# Altium integrated library Integrated Chips.IntLib: 79 symbols
Pins are listed as number, name and electrical type; pins without a type are passive.

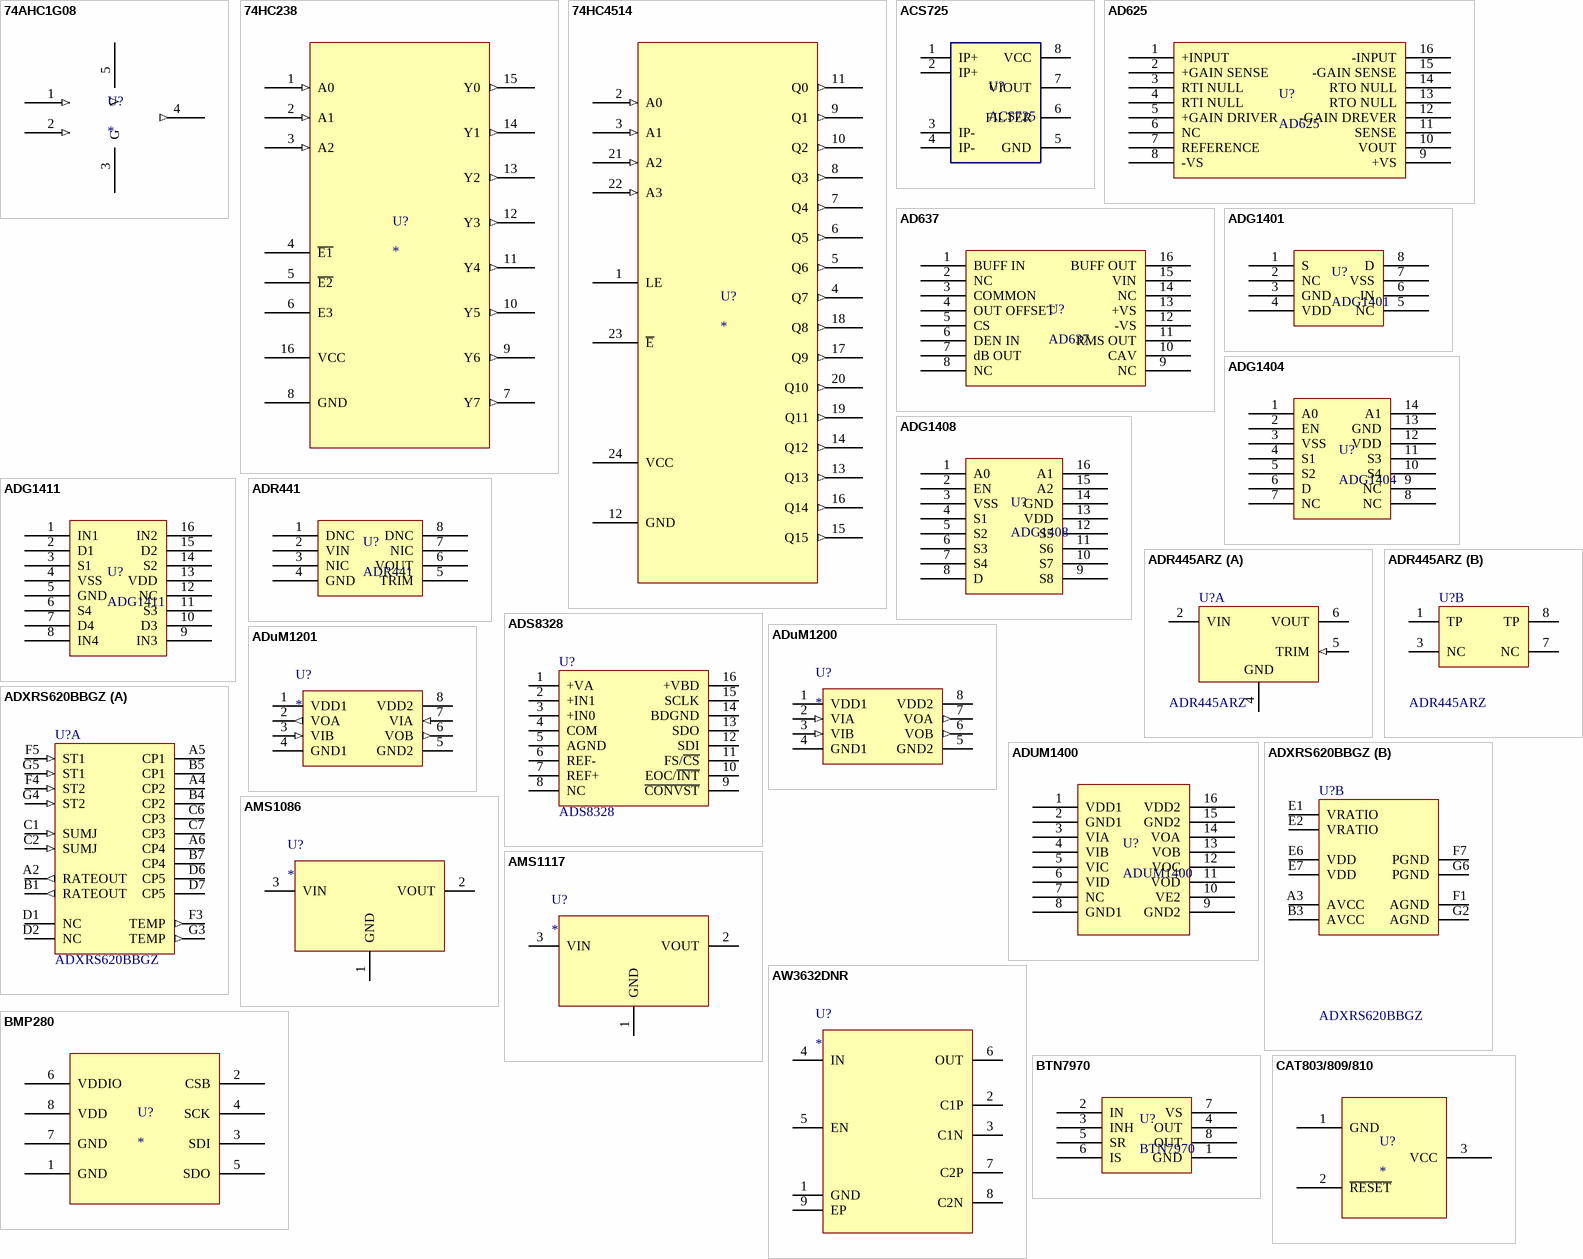
[diagram p0: symbols 74AHC1G08 to CAT803/809/810]

## 74AHC1G08
designator U?
2-input AND gate
footprint SC70_5(SOT353) (SOT353, 5-Leads, Body 2.00x2.10mm, Pitch 0.65mm, IPC Medium Density)
pins: 1 (in), 2 (in), 3 G (power), 4 (out), 5 V (power)

## 74HC238
designator U?
3-to-8 line decoder/demultiplexer
footprint SOIC16_150 (SOP, 16-Leads, Body 9.90x3.90mm, Pitch 1.27mm, IPC Medium Density)
pins: 1 A0 (in), 2 A1 (in), 3 A2 (in), 4 ~{E1}, 5 ~{E2}, 6 E3, 7 Y7 (out), 8 GND (power), 9 Y6 (out), 10 Y5 (out), 11 Y4 (out), 12 Y3 (out), 13 Y2 (out), 14 Y1 (out), 15 Y0 (out), 16 VCC (power)

## 74HC4514
designator U?
4-to-16 line decoder/demultiplexer with input latches
footprint SOIC24_300 (SOIC, 24-Leads, Body 15.40x7.50mm, Pitch 1.27mm, IPC Medium Density)
pins: 1 LE, 2 A0 (in), 3 A1 (in), 4 Q7 (out), 5 Q6 (out), 6 Q5 (out), 7 Q4 (out), 8 Q3 (out), 9 Q1 (out), 10 Q2 (out), 11 Q0 (out), 12 GND (power), 13 Q13 (out), 14 Q12 (out), 15 Q15 (out), 16 Q14 (out), 17 Q9 (out), 18 Q8 (out), 19 Q11 (out), 20 Q10 (out), 21 A2 (in), 22 A3 (in), 23 ~{E}, 24 VCC (power)

## ACS725
designator U?
Automotive-Grade, Galvanically Isolated Current Sensor IC  ACS725 With Common-Mode Field Rejection in a Small Footprint SOIC8 Package
footprint SOIC8_150
pins: 1 IP+, 2 IP+, 3 IP-, 4 IP-, 5 GND, 6 FILTER, 7 VIOUT, 8 VCC

## AD625
designator U?
Programmable Gain Instrumentation Amplifier
footprint DIP16
pins: 1 +INPUT, 2 +GAIN SENSE, 3 RTI NULL, 4 RTI NULL, 5 +GAIN DRIVER, 6 NC, 7 REFERENCE, 8 -VS, 9 +VS, 10 VOUT, 11 SENSE, 12 -GAIN DREVER, 13 RTO NULL, 14 RTO NULL, 15 -GAIN SENSE, 16 -INPUT

## AD637
designator U?
High Precision, Wideband RMS-to-DC Converter
footprint SOIC16_300
pins: 1 BUFF IN, 2 NC, 3 COMMON, 4 OUT OFFSET, 5 CS, 6 DEN IN, 7 dB OUT, 8 NC, 9 NC, 10 CAV, 11 RMS OUT, 12 -VS, 13 +VS, 14 NC, 15 VIN, 16 BUFF OUT

## ADG1401
designator U?
1 Ω On Resistance, ±15 V/+12 V/±5 V iCMOS SPST Switches
footprint MSOP8 (TSOP, 8-Leads, Body 3.00x3.00mm, Pitch 0.65mm, IPC Medium Density)
pins: 1 S, 2 NC, 3 GND, 4 VDD, 5 NC, 6 IN, 7 VSS, 8 D

## ADG1404
designator U?
1.5 Ω On Resistance, ±15 V/12 V/±5 V, 4:1, i CMOS Mulitiplexers
footprint TSSOP14
pins: 1 A0, 2 EN, 3 VSS, 4 S1, 5 S2, 6 D, 7 NC, 8 NC, 9 NC, 10 S4, 11 S3, 12 VDD, 13 GND, 14 A1

## ADG1408
designator U?
4Ω R on , 4-/8-Channel ±15 V/+12 V/±5 V i CMOS Mulitiplexers
footprint TSSOP16 (TSOP, 16-Leads, Body 5.00x4.40mm, Pitch 0.65mm, IPC Medium Density)
pins: 1 A0, 2 EN, 3 VSS, 4 S1, 5 S2, 6 S3, 7 S4, 8 D, 9 S8, 10 S7, 11 S6, 12 S5, 13 VDD, 14 GND, 15 A2, 16 A1

## ADG1411
designator U?
1.5_Ω_On_Resistance,_±15_V/+12_V/±5_V,_iCMOS,_Quad_SPST_Switches
footprint TSSOP16 (TSOP, 16-Leads, Body 5.00x4.40mm, Pitch 0.65mm, IPC Medium Density)
pins: 1 IN1, 2 D1, 3 S1, 4 VSS, 5 GND, 6 S4, 7 D4, 8 IN4, 9 IN3, 10 D3, 11 S3, 12 NC, 13 VDD, 14 S2, 15 D2, 16 IN2

## ADR441
designator U?
Ultralow_Noise,_LDO_XFET_Voltage_References_with_Current_Sink_and_Source
footprint SOIC8_150
pins: 1 DNC, 2 VIN, 3 NIC, 4 GND, 5 TRIM, 6 VOUT, 7 NIC, 8 DNC

## ADR445ARZ
designator U?
Ultralow Noise, LDO XFET Voltage Reference with Current Sink and Source, 5 V Output, 5.5 to 18 V Supply, Industrial, 8-pin SOIC (R-8), Tube; Manufacturer: Analog Devices; Max V Supply (V): 18; Min V Supply (V): 5.5; Ref Out TC (ppm/C): 2; Vout: 5V; DatasheetVersion: Rev. E; PackageVersion: 060506-A, 06/2006; PackageReference: R-8; PackageDescription: 8-Pin Standard Small Outline Package, Body 4.9 x 3.9 mm, Pitch 1.27 mm; Supplier 1: Digi-Key; Supplier Part Number 1: ADR445ARZ-ND; Supplier 2: Farnell; Supplier Part Number 2: 1274149; Supplier 3: Mouser; Supplier Part Number 3: 584-ADR445ARZ; Packing: Tube; Operating Temp Range: -40 to 125 degC; Mounting Technology: Surface Mount; Code_JEDEC: MS-012-AA; PartNumber: ADR445ARZ; ComponentLink1Description: Manufacturer URL; ComponentLink1URL: http://www.analog.com/en/index.html; ComponentLink2Description: Datasheet; ComponentLink2URL: http://www.analog.com/static/imported-files/data_sheets/ADR440_441_443_444_445.pdf; ComponentLink3Description: Package Specification; ComponentLink3URL: http://www.analog.com/static/imported-files/packages/PKG_PDF/SOIC_Narrow%20(R)/R_8.pdf; ComponentLink4Description: URL Link1; ComponentLink4URL: Product URL:http://www.analog.com/en/special-linear-functions/voltage-references/adr445/products/product.html
footprint SOIC8_150
part A pins: 2 VIN (power), 4 GND (power), 5 TRIM (in), 6 VOUT (power)
part B pins: 1 TP, 3 NC, 7 NC, 8 TP

## ADS8328
designator U?
16 Bit AD Converter, dual unipolar input
footprint TSSOP16 (TSOP, 16-Leads, Body 5.00x4.40mm, Pitch 0.65mm, IPC Medium Density)
pins: 1 +VA (power), 2 +IN1 (power), 3 +IN0 (power), 4 COM (power), 5 AGND (power), 6 REF- (power), 7 REF+ (power), 8 NC (power), 9 ~{CONVST} (power), 10 EOC/~{INT} (power), 11 FS/~{CS} (power), 12 SDI (power), 13 SDO (power), 14 BDGND (power), 15 SCLK (power), 16 +VBD (power)

## ADuM1200
designator U?
footprint SOIC8_150
pins: 1 VDD1 (power), 2 VIA (in), 3 VIB (in), 4 GND1 (power), 5 GND2 (power), 6 VOB (out), 7 VOA (out), 8 VDD2 (power)

## ADuM1201
designator U?
footprint SOIC8_150
pins: 1 VDD1 (power), 2 VOA (out), 3 VIB (in), 4 GND1 (power), 5 GND2 (power), 6 VOB (out), 7 VIA (in), 8 VDD2 (power)

## ADUM1400
designator U?
Quad-Channel Digital Isolators
footprint SOIC16_300
pins: 1 VDD1, 2 GND1, 3 VIA, 4 VIB, 5 VIC, 6 VID, 7 NC, 8 GND1, 9 GND2, 10 VE2, 11 VOD, 12 VOC, 13 VOB, 14 VOA, 15 GND2, 16 VDD2

## ADXRS620BBGZ
designator U?
Yaw Rate Gyroscope; Manufacturer: Analog Devices; -3dB Bandwidth: 2.5 KHz; Nonliniarity: 0.1% of FS; Output Type: Analog; Packing: Tray; Sensitivity: 6 mv/degrees/s; Supply Current: 3.5 mA; Temp Sensor: Yes; Voltage Reference: No; Voltage Supply (V): 4.75 to 5.25; DatasheetVersion: Rev. B; PackageVersion: 042307-A, 04/2007; PackageReference: BG-32-3; PackageDescription: 32-Ball Ceramic Ball Grid Array, 6.85 x 6.85 mm Body, 0.8 mm Pitch; Supplier 1: Digi-Key; Supplier Part Number 1: ADXRS620BBGZ-ND; Supplier 2: Farnell; Supplier Part Number 2: 2305763; Supplier 3: Newark; Supplier Part Number 3: 91R2569; Supplier 4: Mouser; Supplier Part Number 4: 584-ADXRS620BBGZ; Mounting Technology: Surface Mount; PartNumber: ADXRS620BBGZ; ComponentLink1Description: Manufacturer URL; ComponentLink1URL: http://www.analog.com/en/index.html; ComponentLink2Description: Datasheet; ComponentLink2URL: http://www.analog.com/static/imported-files/data_sheets/ADXRS620.pdf; ComponentLink3Description: Package Specification; ComponentLink3URL: http:/www.analog.com/static/imported-files/packages/6438543BG_32_3.pdf; ComponentLink4Description: Product URL; ComponentLink4URL: http://www.analog.com/en/mems-sensors/mems-inertial-sensors/adxrs620/products/product.html
footprint BGA32_80P_0707
part A pins: A2 RATEOUT (out) "Rate Signal Output.", A4 CP2 "Charge Pump Capacitor (22 nF).", A5 CP1 "Charge Pump Capacitor (22 nF).", A6 CP4 "Charge Pump Capacitor (22 nF).", B1 RATEOUT (out) "Rate Signal Output.", B4 CP2 "Charge Pump Capacitor (22 nF).", B5 CP1 "Charge Pump Capacitor (22 nF).", B7 CP4 "Charge Pump Capacitor (22 nF).", C1 SUMJ (in) "Output Amp Summing Junction.", C2 SUMJ (in) "Output Amp Summing Junction.", C6 CP3 "Charge Pump Capacitor (22 nF).", C7 CP3 "Charge Pump Capacitor (22 nF).", D1 NC "No Connect.", D2 NC "No Connect.", D6 CP5 (power) "HV Filter Capacitor (0.1 uF).", D7 CP5 (power) "HV Filter Capacitor (0.1 uF).", F3 TEMP (out) "Temperature Voltage Output.", F4 ST2 (in) "Self-Test for Sensor 2.", F5 ST1 (in) "Self-Test for Sensor 1.", G3 TEMP (out) "Temperature Voltage Output.", G4 ST2 (in) "Self-Test for Sensor 2.", G5 ST1 (in) "Self-Test for Sensor 1."
part B pins: A3 AVCC (power) "Positive Analog Supply.", B3 AVCC (power) "Positive Analog Supply.", E1 VRATIO (power) "Reference Supply for Ratiometric Output.", E2 VRATIO (power) "Reference Supply for Ratiometric Output.", E6 VDD (power) "Positive Charge Pump Supply.", E7 VDD (power) "Positive Charge Pump Supply.", F1 AGND (power) "Analog Supply Return.", F7 PGND (power) "Charge Pump Supply Return.", G2 AGND (power) "Analog Supply Return.", G6 PGND (power) "Charge Pump Supply Return."

## AMS1086
designator U?
footprint TO-263AA(D2PAK)
pins: 1 GND (power), 2 VOUT (power), 3 VIN (power)

## AMS1117
designator U?
footprint SOT223 (SOT223, 4-Leads, Body 6.50x7.00mm (avg), Pitch 2.30mm, IPC Medium Density)
pins: 1 GND (power), 2 VOUT (power), 3 VIN (power)

## AW3632DNR
designator U?
footprint DFN8_2X2 (QFN, 8-Leads, Body 2.00x2.00mm, Pitch 0.50mm, Thermal Pad 0.60x1.20mm, IPC Medium Density)
pins: 1 GND, 2 C1P, 3 C1N, 4 IN, 5 EN, 6 OUT, 7 C2P, 8 C2N, 9 EP

## BMP280
designator U?
Digital pressure sensor
footprint BMP280
pins: 1 GND, 2 CSB, 3 SDI, 4 SCK, 5 SDO, 6 VDDIO, 7 GND, 8 VDD

## BTN7970
designator U?
High Current PN Half Bridge / NovalithIC™
footprint TO-263-7
pins: 1 GND (power), 2 IN (power), 3 INH (power), 4 OUT (power), 5 SR (power), 6 IS (power), 7 VS (power), 8 OUT (power)

## CAT803/809/810
designator U?
3-Pin Microprocessor power supply supervisors
footprint SOT23_3_1 (SOT23, 3-Leads, Body 2.92x2.37mm, Pitch 0.95mm, IPC Medium Density)
pins: 1 GND (power), 2 ~{RESET}, 3 VCC (power)

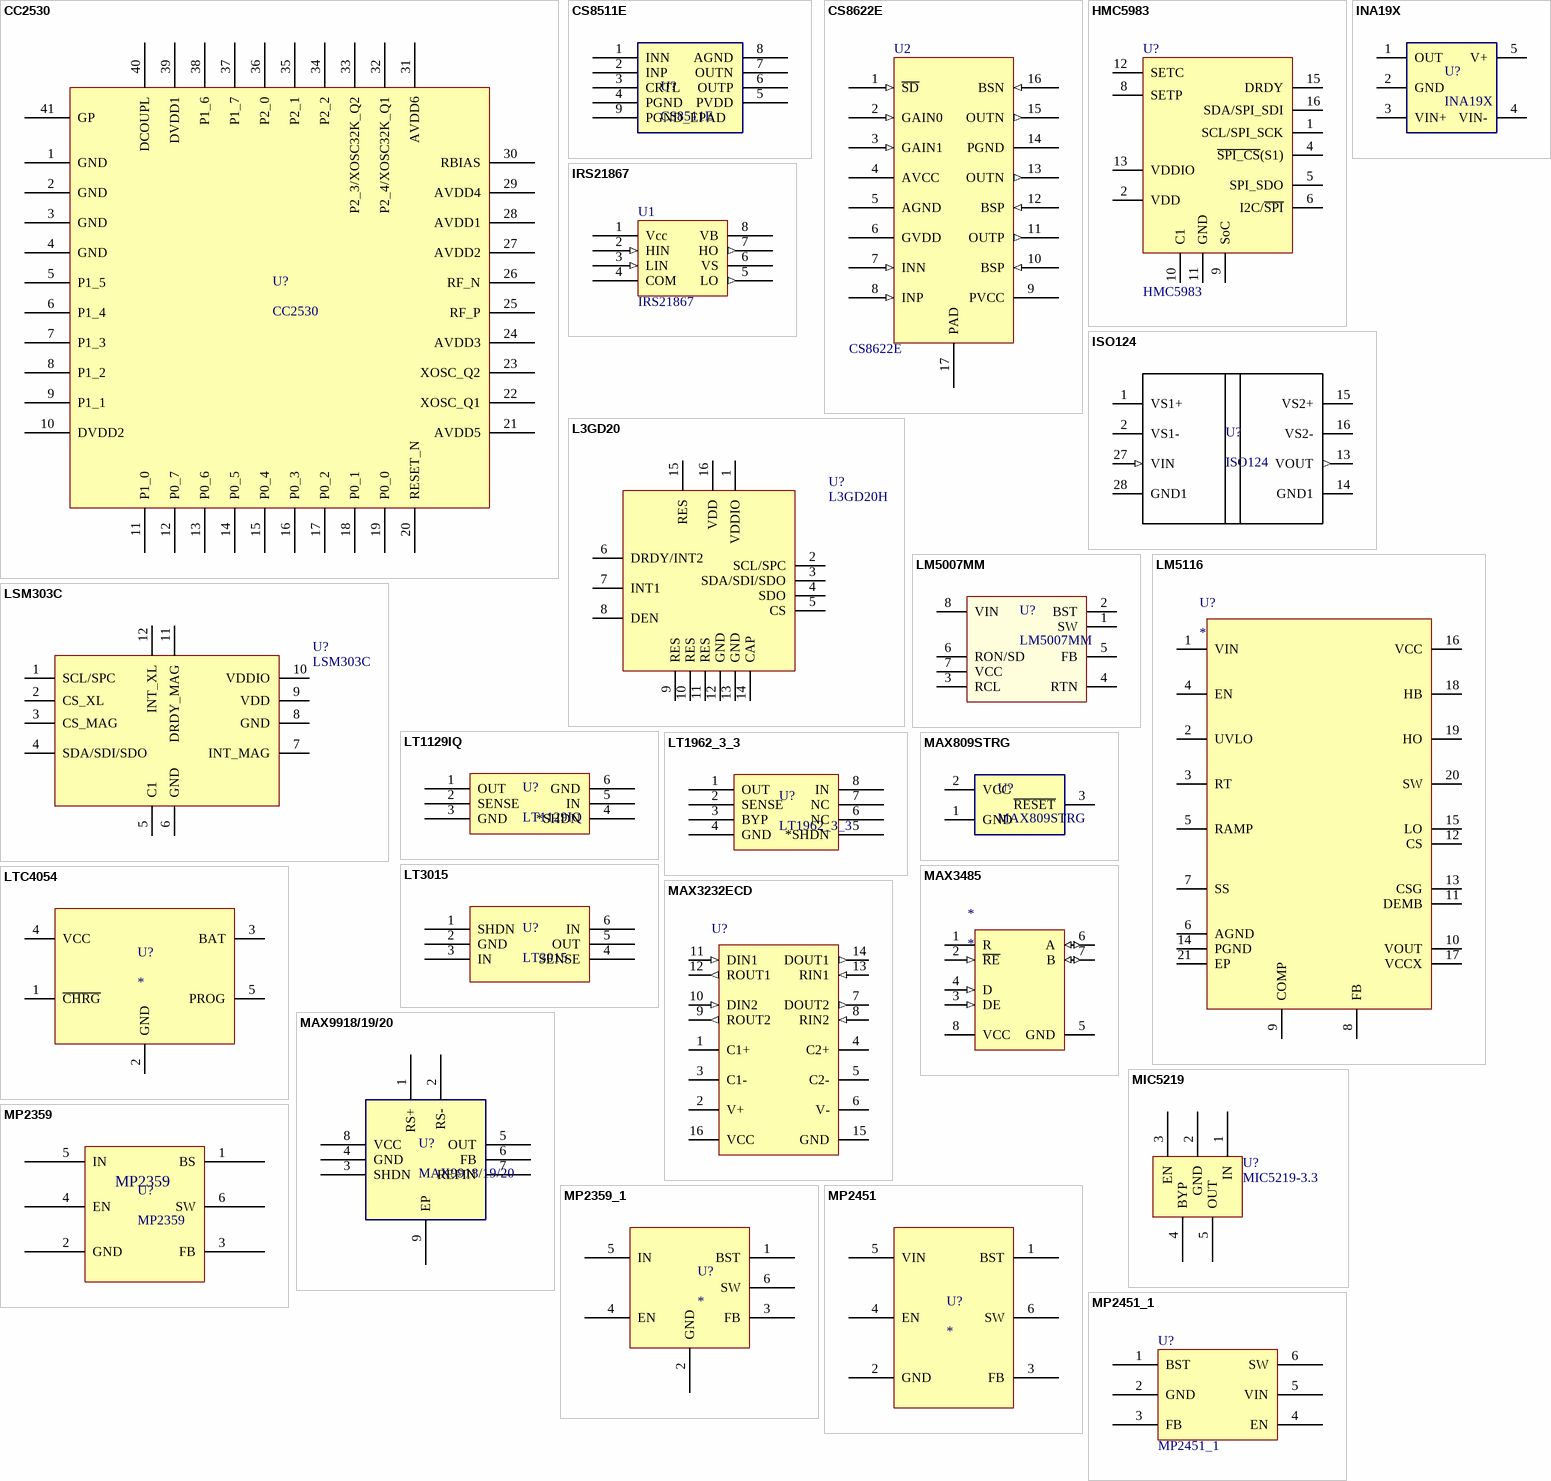
[diagram p1: symbols CC2530 to MP2451_1]

## CC2530
designator U?
2.4G Zigbee application Soc
footprint QFN40_50P_EP (PQFN, 40-Leads, Body 6.00x6.00mm, Pitch 0.50mm, Thermal Pad 4.50x4.50mm, IPC Medium Density)
pins: 1 GND, 2 GND, 3 GND, 4 GND, 5 P1_5, 6 P1_4, 7 P1_3, 8 P1_2, 9 P1_1, 10 DVDD2, 11 P1_0, 12 P0_7, 13 P0_6, 14 P0_5, 15 P0_4, 16 P0_3, 17 P0_2, 18 P0_1, 19 P0_0, 20 RESET_N, 21 AVDD5, 22 XOSC_Q1, 23 XOSC_Q2, 24 AVDD3, 25 RF_P, 26 RF_N, 27 AVDD2, 28 AVDD1, 29 AVDD4, 30 RBIAS, 31 AVDD6, 32 P2_4/XOSC32K_Q1, 33 P2_3/XOSC32K_Q2, 34 P2_2, 35 P2_1, 36 P2_0, 37 P1_7, 38 P1_6, 39 DVDD1, 40 DCOUPL, 41 GP

## CS8511E
designator U?
footprint SOIC8_150_EP (SOIC, 8-Leads, Body 4.90x3.90mm, Pitch 1.27mm, Thermal Pad 3.17x2.43mm, IPC Medium Density)
pins: 1 INN, 2 INP, 3 CRTL, 4 PGND, 5 PVDD, 6 OUTP, 7 OUTN, 8 AGND, 9 PGND_EPAD

## CS8622E
designator U2
footprint SOIC16_150_EP (SOP, 16-Leads, Body 9.90x3.90mm, Pitch 1.27mm, Thermal Pad 4.50x3.00mm, IPC Medium Density)
pins: 1 ~{SD} (in), 2 GAIN0 (in), 3 GAIN1 (in), 4 AVCC (power), 5 AGND (power), 6 GVDD (power), 7 INN (in), 8 INP (in), 9 PVCC (power), 10 BSP (in), 11 OUTP (out), 12 BSP (in), 13 OUTN (out), 14 PGND (power), 15 OUTN (out), 16 BSN (in), 17 PAD (power)

## HMC5983
designator U?
3-Axis digital compass IC
footprint QFN16_50P
pins: 1 SCL/SPI_SCK, 2 VDD, 4 ~{SPI_CS}(S1), 5 SPI_SDO, 6 I2C/~{SPI}, 8 SETP, 9 SoC, 10 C1, 11 GND, 12 SETC, 13 VDDIO, 15 DRDY, 16 SDA/SPI_SDI

## INA19X
designator U?
Pinout #1gain=20/50/100CURRENT SHUNT MONITOR  −16V to +80V Common-Mode Range
footprint SOT23_5 (SOT23, 5-Leads, Body 2.90x2.70mm, Pitch 0.95mm, IPC Medium Density)
pins: 1 OUT, 2 GND, 3 VIN+, 4 VIN-, 5 V+

## IRS21867
designator U1
footprint SOIC8_150
pins: 1 Vcc (power), 2 HIN (in), 3 LIN (in), 4 COM (power), 5 LO (out), 6 VS (power), 7 HO (out), 8 VB (power)

## ISO124
designator U?
ISO124 Precision Lowest-Cost Isolation Amplifier
footprint SOIC16_DVA (Footprint not found)
pins: 1 VS1+ (power), 2 VS1- (power), 13 VOUT (out), 14 GND1 (power), 15 VS2+ (power), 16 VS2- (power), 27 VIN (in), 28 GND1 (power)

## L3GD20
designator U?, comment L3GD20H
3-Axis digital gyroscope
footprint LGA16_3X3
pins: 1 VDDIO, 2 SCL/SPC, 3 SDA/SDI/SDO, 4 SDO, 5 CS, 6 DRDY/INT2, 7 INT1, 8 DEN, 9 RES, 10 RES, 11 RES, 12 GND, 13 GND, 14 CAP, 15 RES, 16 VDD

## LM5007MM
designator U?
LM5007 High Voltage 80-V Step Down Switching Regulator
footprint MSOP8 (TSOP, 8-Leads, Body 3.00x3.00mm, Pitch 0.65mm, IPC Medium Density)
pins: 1 SW (power), 2 BST, 3 RCL, 4 RTN (power), 5 FB, 6 RON/SD, 7 VCC (power), 8 VIN (power)

## LM5116
designator U?
footprint TSSOP20_EP (TSOP, 20-Leads, Body 6.50x4.40mm, Pitch 0.65mm, Thermal Pad 4.35x3.15mm, IPC Medium Density)
pins: 1 VIN, 2 UVLO, 3 RT, 4 EN, 5 RAMP, 6 AGND, 7 SS, 8 FB, 9 COMP, 10 VOUT, 11 DEMB, 12 CS, 13 CSG, 14 PGND, 15 LO, 16 VCC, 17 VCCX, 18 HB, 19 HO, 20 SW, 21 EP

## LSM303C
designator U?
3D accelerometer and 3D magnetometer
footprint LGA12_2X2
pins: 1 SCL/SPC, 2 CS_XL, 3 CS_MAG, 4 SDA/SDI/SDO, 5 C1, 6 GND, 7 INT_MAG, 8 GND, 9 VDD, 10 VDDIO, 11 DRDY_MAG, 12 INT_XL

## LT1129IQ
designator U?
LT3015: 1.5A, Low Noise, Negative Linear Regulator with Precision Current Limit
footprint TO-263-5
pins: 1 OUT, 2 SENSE, 3 GND, 4 *SHDN, 5 IN, 6 GND

## LT1962_3_3
designator U?
LT1962: 300mA, Low Noise, Micropower LDO Regulators
footprint MSOP8 (TSOP, 8-Leads, Body 3.00x3.00mm, Pitch 0.65mm, IPC Medium Density)
pins: 1 OUT, 2 SENSE, 3 BYP, 4 GND, 5 *SHDN, 6 NC, 7 NC, 8 IN

## LT3015
designator U?
LT3015: 1.5A, Low Noise, Negative Linear Regulator with Precision Current Limit
footprint TO-263-5
pins: 1 SHDN, 2 GND, 3 IN, 4 SENSE, 5 OUT, 6 IN

## LTC4054
designator U?
footprint SOT23_5L (SOT23, 5-Leads, Body 2.92x2.79mm, Pitch 0.95mm, IPC High Density)
pins: 1 ~{CHRG}, 2 GND (power), 3 BAT (power), 4 VCC (power), 5 PROG (power)

## MAX809STRG
designator U?
Very Low Supply Current  3-Pin Microprocessor  Reset Monitors
footprint SOT23_3_1 (SOT23, 3-Leads, Body 2.92x2.37mm, Pitch 0.95mm, IPC Medium Density)
pins: 1 GND, 2 VCC, 3 ~{RESET}

## MAX3232ECD
designator U?
3-V to 5.5-V Multichannel RS-232 Line Driver / Receiver with ?5-kV IEC ESD Protection, 0 to 70 degC, 16-Pin SOIC (D), Green (RoHS & no Sb/Br); Drivers Per Package: 2; Supply Voltage(s)(V): 3.3 or 5.0; ESD HBM(kV): +/-15; ICC(Max)(mA): 1; Single Supply: TRUE; DatasheetVersion: SLLS664A; PackageVersion: revM, Jun-2011; PackageReference: D16; PackageDescription: 16-Pin Plastic Small Outline Integrated Circuit, 9.9 x 3.9 mm, Pitch 1.27 mm Pitch; SubFamily: RS-232; Receivers Per Package: 2; RS-232: TRUE; IEC-61000-4-2 SUPPORT: TRUE; ComponentLink1Description: Manufacturer URL; ComponentLink1URL: www.ti.com; ComponentLink2Description: Datasheet; ComponentLink2URL: http://www.ti.com/general/docs/lit/getliterature.tsp?genericPartNumber=MAX3232E&fileType=pdf; ComponentLink3Description: Package Specification; ComponentLink3URL: http://www.ti.com/litv/pdf/mpds178g
footprint SOIC16_150 (SOP, 16-Leads, Body 9.90x3.90mm, Pitch 1.27mm, IPC Medium Density)
pins: 1 C1+, 2 V+ (power), 3 C1-, 4 C2+, 5 C2-, 6 V- (power), 7 DOUT2 (out), 8 RIN2 (in), 9 ROUT2 (out), 10 DIN2 (in), 11 DIN1 (in), 12 ROUT1 (out), 13 RIN1 (in), 14 DOUT1 (out), 15 GND (power), 16 VCC (power)

## MAX3485
designator *
footprint SOIC8_150
pins: 1 R (hiz), 2 ~{RE} (in), 3 DE (in), 4 D (in), 5 GND (power), 6 A (io), 7 B (io), 8 VCC (power)

## MAX9918/19/20
designator U?
footprint SOIC8_150_EP (SOIC, 8-Leads, Body 4.90x3.90mm, Pitch 1.27mm, Thermal Pad 3.17x2.43mm, IPC Medium Density)
pins: 1 RS+, 2 RS-, 3 SHDN, 4 GND, 5 OUT, 6 FB, 7 REFIN, 8 VCC, 9 EP

## MIC5219
designator U?, comment MIC5219-3.3
footprint SOT23_5 (SOT23, 5-Leads, Body 2.90x2.70mm, Pitch 0.95mm, IPC Medium Density)
pins: 1 IN, 2 GND, 3 EN, 4 BYP, 5 OUT

## MP2359
designator U?
MP2359 – 1.2A, 24V, 1.4MHz STEP-DOWN CONVERTER IN A TSOT23-6
footprint SOT23_6 (SOT23, 6-Leads, Body 2.90x2.80mm, Pitch 0.95mm, IPC Medium Density)
pins: 1 BS, 2 GND, 3 FB, 4 EN, 5 IN, 6 SW

## MP2359_1
designator U?
footprint SOT23_6 (SOT23, 6-Leads, Body 2.90x2.80mm, Pitch 0.95mm, IPC Medium Density)
pins: 1 BST, 2 GND (power), 3 FB, 4 EN, 5 IN (power), 6 SW

## MP2451
designator U?
footprint SOT23_6 (SOT23, 6-Leads, Body 2.90x2.80mm, Pitch 0.95mm, IPC Medium Density)
pins: 1 BST, 2 GND, 3 FB, 4 EN, 5 VIN, 6 SW

## MP2451_1
designator U?
footprint SOT23_6 (SOT23, 6-Leads, Body 2.90x2.80mm, Pitch 0.95mm, IPC Medium Density)
pins: 1 BST, 2 GND, 3 FB, 4 EN, 5 VIN, 6 SW

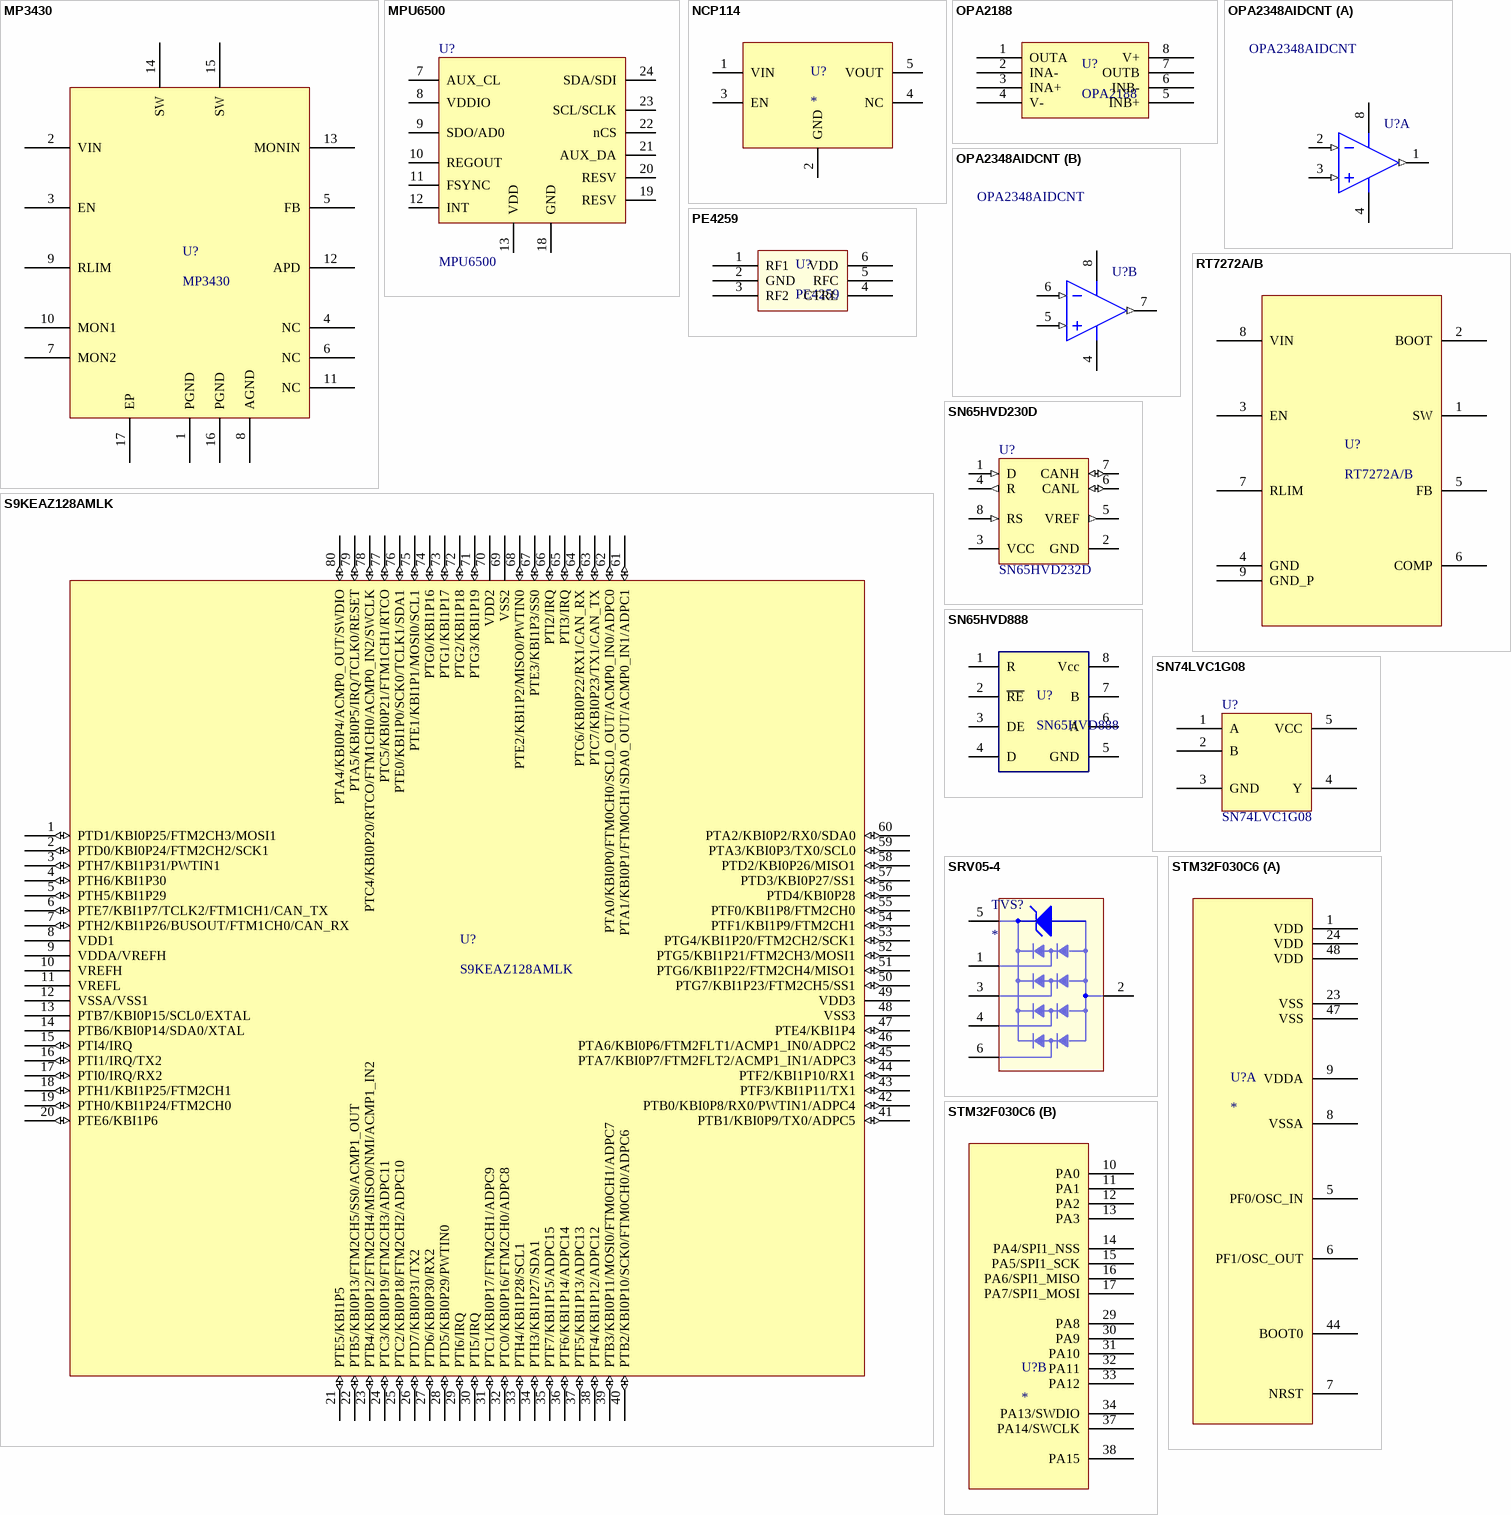
[diagram p2: symbols MP3430 to STM32F030C6]

## MP3430
designator U?
pins: 1 PGND, 2 VIN, 3 EN, 4 NC, 5 FB, 6 NC, 7 MON2, 8 AGND, 9 RLIM, 10 MON1, 11 NC, 12 APD, 13 MONIN, 14 SW, 15 SW, 16 PGND, 17 EP

## MPU6500
designator U?
footprint QFN24_40P_EP
pins: 7 AUX_CL, 8 VDDIO, 9 SDO/AD0, 10 REGOUT, 11 FSYNC, 12 INT, 13 VDD, 18 GND, 19 RESV, 20 RESV, 21 AUX_DA, 22 nCS, 23 SCL/SCLK, 24 SDA/SDI

## NCP114
designator U?
footprint SOT23_5 (SOT23, 5-Leads, Body 2.90x2.70mm, Pitch 0.95mm, IPC Medium Density)
pins: 1 VIN (power), 2 GND (power), 3 EN, 4 NC, 5 VOUT (power)

## OPA2188
designator U?
OPA2188 0.03-μV/°C Drift, Low-Noise, Rail-to-Rail Output, 36-V, Zero-Drift
footprint SOP_8 (Footprint not found)
footprint SOIC8_150
pins: 1 OUTA, 2 INA-, 3 INA+, 4 V-, 5 INB+, 6 INB-, 7 OUTB, 8 V+

## OPA2348AIDCNT
designator U?
1 MHz, 45 uA, RRIO, Dual Operational Amplifier, 2.1 to 5.5 V, -40 to 125 degC, 8-pin SOP (DCN8), Green (RoHS & no Sb/Br); Manufacturer: Texas Instruments; CMRR(Min)(dB): 70; GBW(Typ)(MHz): 1; IIB(Max)(pA): 10; Iq per channel(Max)(mA): 0.065; Number of Channels: 2; Offset Drift(Typ)(uV/C): 4; Packing: SMALL T&R; Rating: Catalog; Slew Rate(Typ)(V/us): 0.5; Sub Family: Low Input Bias Current Amp (<=10pA), Low Power Amp (<=500uA), Low Supply Voltage Amplifier (<=2.7V), Precision Amplifier; Total Supply Voltage(Max)(+5V is 5, +/-5V is 10): 5.5; Total Supply Voltage(Min)(+5V is 5, +/-5V is 10): 2.1; Vio (25C)(Max)(mV): 5; DatasheetVersion: SBOS213G; PackageVersion: 4202106/D, 11/2009; PackageReference: DCN8; PackageDescription: 8-Pin Plastic Small Outline, Body 1.6 x 2.9 mm, Pitch 0.65 mm; Supplier 1: Digi-Key; Supplier Part Number 1: 296-13008-2-ND; Supplier 2: Digi-Key; Supplier Part Number 2: 296-13008-1-ND; Supplier 3: Digi-Key; Supplier Part Number 3: 296-13008-6-ND; Supplier 4: Newark; Supplier Part Number 4: 75C4724; Supplier 5: Mouser; Supplier Part Number 5: 595-OPA2348AIDCNT; Eco-Plan: Green (RoHS & no Sb/Br); Mounting Technology: Surface Mount; Code_JEDEC: MO-178; PartNumber: OPA2348AIDCNT; ComponentLink1Description: Manufacturer URL; ComponentLink1URL: http://www.ti.com/; ComponentLink2Description: Datasheet; ComponentLink2URL: http://www.ti.com/lit/ds/symlink/opa2348.pdf; ComponentLink3Description: Package Specification; ComponentLink3URL: http://www.ti.com/lit/ml/mpds099c/mpds099c.pdf
footprint SOT23_8 (TSOP, 8-Leads, Body 2.90x1.60mm, Pitch 0.65mm, IPC Medium Density)
pins on every part: 4 V- (power), 8 V+ (power)
part A pins: 1 OUT A (out), 2 IN A- (in), 3 IN A+ (in)
part B pins: 5 IN B+ (in), 6 IN B- (in), 7 OUT B (out)

## PE4259
designator U?
PE4259 Peregrine RF Switch
footprint SC70_6(SOT363)
pins: 1 RF1, 2 GND, 3 RF2, 4 CTRL, 5 RFC, 6 VDD

## RT7272A/B
designator U?
footprint SOIC8_150_EP (SOIC, 8-Leads, Body 4.90x3.90mm, Pitch 1.27mm, Thermal Pad 3.17x2.43mm, IPC Medium Density)
pins: 1 SW, 2 BOOT, 3 EN, 4 GND, 5 FB, 6 COMP, 7 RLIM, 8 VIN, 9 GND_P
